# Altium footprint library General.PcbLib: 246 footprints (part 12 of 16)
Each footprint in its own frame and in the unit in brackets; x right, y up, seen from the top. Pads: shape width x height; smd on the part's side, far side on the other; paste and mask are expansions set on the pad; w line width, h text height; cw(c..) or ccw(c..) is an arc to the next point about the centre after c.
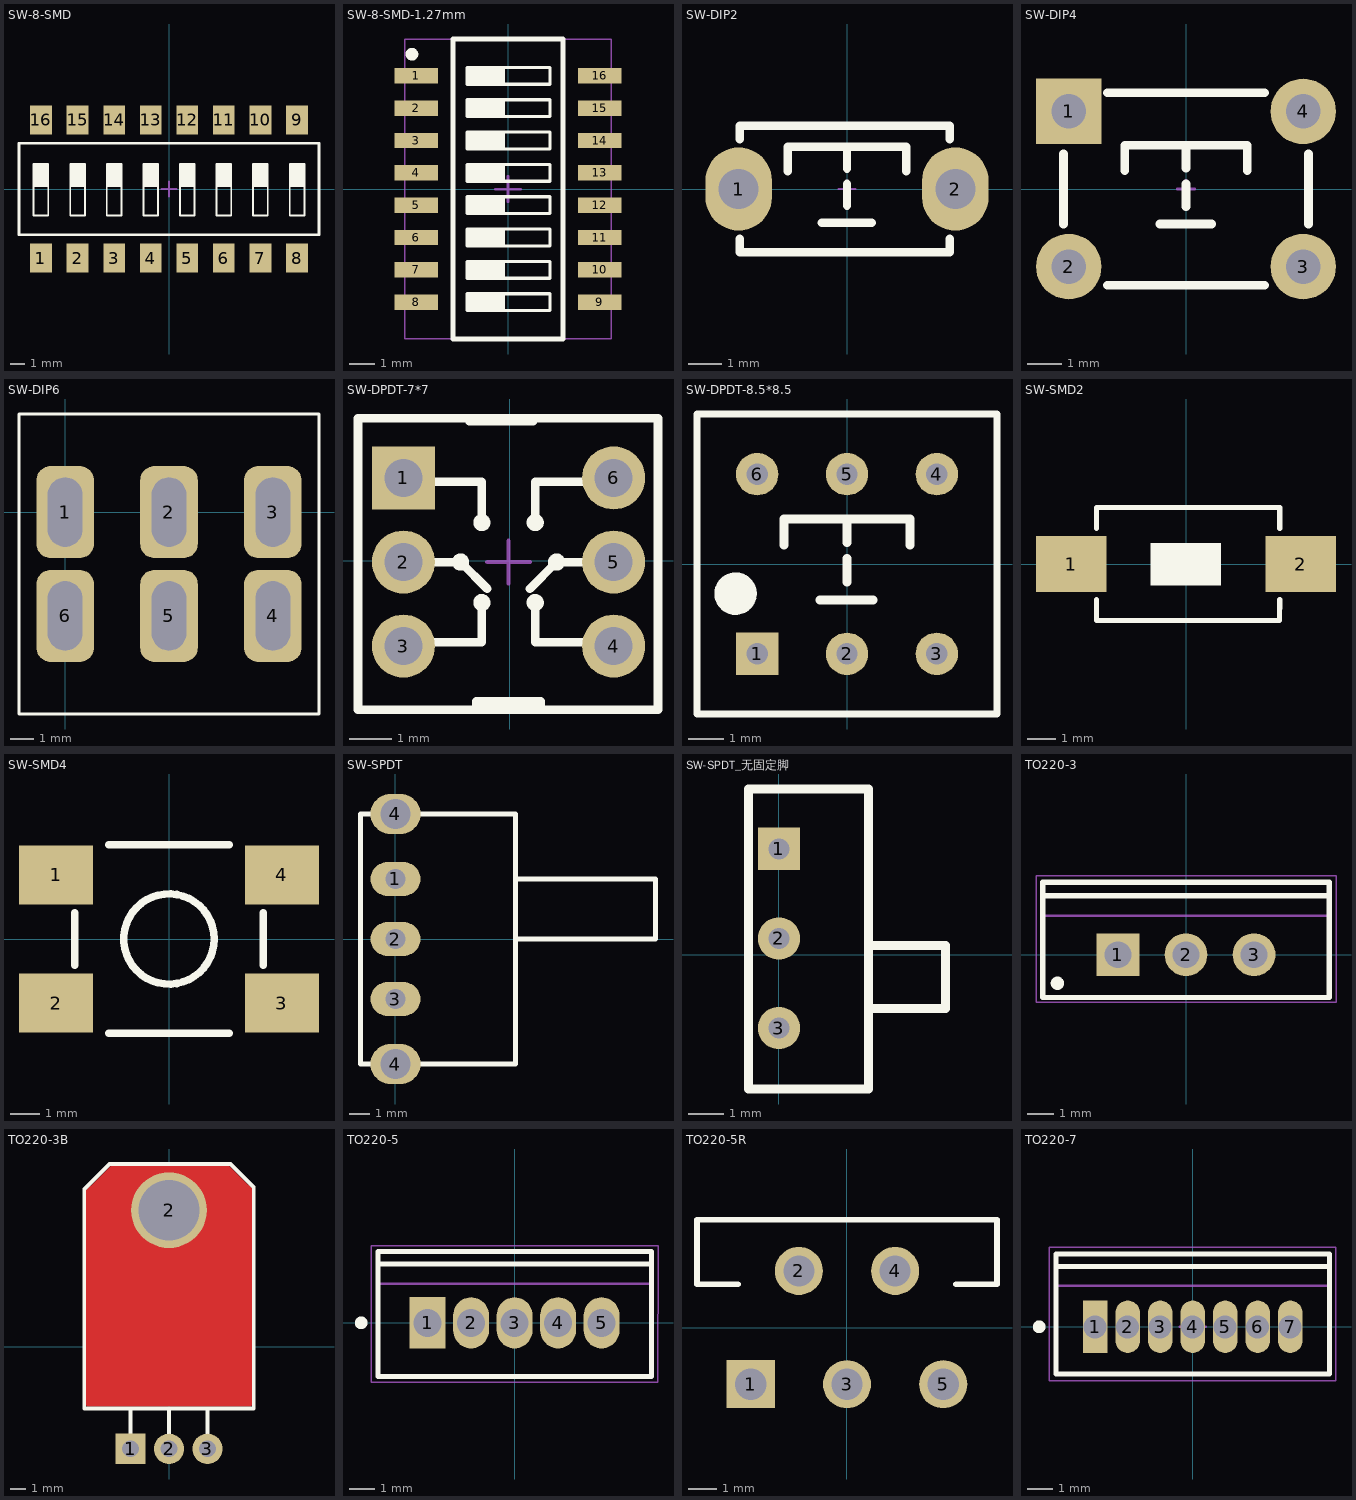
[diagram p11: the footprints below, top view; thin cyan lines are the x and y axes]

## SW-8-SMD [mm] "pitch2.54mm  8位贴片拨码开关"
height 1.75
pads (16):
  rect 1.5x2 smd: 1(-8.89,-4.8) 2(-6.35,-4.8) 3(-3.81,-4.8) 4(-1.27,-4.8) 5(1.27,-4.8) 6(3.81,-4.8) 7(6.35,-4.8) 8(8.89,-4.8) 9(8.89,4.8) 10(6.35,4.8) 11(3.81,4.8) 12(1.27,4.8) 13(-1.27,4.8) 14(-3.81,4.8) 15(-6.35,4.8) 16(-8.89,4.8)
Top Overlay:
  rectangle: 8.382,0.203 9.398,1.727
  rectangle: 5.842,0.203 6.858,1.727
  rectangle: 3.302,0.203 4.318,1.727
  rectangle: 0.762,0.203 1.778,1.727
  rectangle: -9.398,0.203 -8.382,1.727
  rectangle: -6.858,0.203 -5.842,1.727
  rectangle: -4.318,0.203 -3.302,1.727
  rectangle: -1.778,0.203 -0.762,1.727
  lines w0.127: -9.398,0.203 -8.382,0.203 ; -6.858,0.203 -5.842,0.203 ; -4.318,0.203 -3.302,0.203 ; -1.778,0.203 -0.762,0.203 ; 0.762,0.203 1.778,0.203 ; 3.302,0.203 4.318,0.203 ; 5.842,0.203 6.858,0.203 ; 8.382,0.203 9.398,0.203 ; -9.398,-1.829 -9.398,1.727 -8.382,1.727 -8.382,-1.829 -9.398,-1.829 ; -6.858,-1.829 -6.858,1.727 -5.842,1.727 -5.842,-1.829 -6.858,-1.829 ; -4.318,-1.829 -4.318,1.727 -3.302,1.727 -3.302,-1.829 -4.318,-1.829 ; -1.778,-1.829 -1.778,1.727 -0.762,1.727 -0.762,-1.829 -1.778,-1.829 ; 0.762,-1.829 1.778,-1.829 1.778,1.727 0.762,1.727 0.762,-1.829 ; 3.302,-1.829 4.318,-1.829 4.318,1.727 3.302,1.727 3.302,-1.829 ; 5.842,-1.829 6.858,-1.829 6.858,1.727 5.842,1.727 5.842,-1.829 ; 8.382,-1.829 9.398,-1.829 9.398,1.727 8.382,1.727 8.382,-1.829
  lines w0.2: -10.414,-0.861 -10.414,3.175 10.414,3.175 10.414,-3.175 -10.414,-3.175 -10.414,-0.762
Mechanical 15:
  lines w0.15: -0.508,0 0.508,0 ; 0,-0.508 0,0.508
3D body "User Library-smt_dip_sw_8pos.step": height 6.05, standoff 0, extent -11.075,-5.14 11.025,5.14

## SW-8-SMD-1.27mm [mm] "SWITCH, 16-Leads, Pitch 1.27mm"
height 2.3
pads (16):
  rect 1.7x0.6 smd: 1(-3.6,4.445) 2(-3.6,3.175) 3(-3.6,1.905) 4(-3.6,0.635) 5(-3.6,-0.635) 6(-3.6,-1.905) 7(-3.6,-3.175) 8(-3.6,-4.445) 9(3.6,-4.445) 10(3.6,-3.175) 11(3.6,-1.905) 12(3.6,-0.635) 13(3.6,0.635) 14(3.6,1.905) 15(3.6,3.175) 16(3.6,4.445)
Top Overlay:
  circle w0.25: c-3.775,5.295 r0.125
  region: -0.178,0.33 -0.178,0.965 -1.6,0.965 -1.6,0.33
  region: -0.178,-0.94 -0.178,-0.305 -1.6,-0.305 -1.6,-0.94
  region: -0.178,-4.75 -0.178,-4.115 -1.6,-4.115 -1.6,-4.75
  region: -0.178,-3.48 -0.178,-2.845 -1.6,-2.845 -1.6,-3.48
  region: -0.178,-2.21 -0.178,-1.575 -1.6,-1.575 -1.6,-2.21
  region: -0.178,4.14 -0.178,4.75 -1.6,4.75 -1.6,4.14
  region: -0.178,2.87 -0.178,3.505 -1.6,3.505 -1.6,2.87
  region: -0.178,1.6 -0.178,2.235 -1.6,2.235 -1.6,1.6
  lines w0.127: -0.178,-4.75 -0.178,-4.14 ; -0.178,-3.48 -0.178,-2.87 ; -0.178,-2.21 -0.178,-1.6 ; -0.178,-0.94 -0.178,-0.33 ; -0.178,0.33 -0.178,0.94 ; -0.178,1.6 -0.178,2.21 ; -0.178,2.87 -0.178,3.48 ; -0.178,4.14 -0.178,4.75 ; -1.6,-4.775 1.651,-4.775 1.651,-4.115 -1.6,-4.115 -1.6,-4.775 ; -1.6,-3.505 -1.6,-2.845 1.651,-2.845 1.651,-3.505 -1.6,-3.505 ; -1.6,-2.235 -1.6,-1.575 1.651,-1.575 1.651,-2.235 -1.6,-2.235 ; -1.6,-0.965 -1.6,-0.305 1.651,-0.305 1.651,-0.965 -1.6,-0.965 ; -1.6,0.305 1.651,0.305 1.651,0.965 -1.6,0.965 -1.6,0.305 ; -1.6,1.575 1.651,1.575 1.651,2.235 -1.6,2.235 -1.6,1.575 ; -1.6,2.845 1.651,2.845 1.651,3.505 -1.6,3.505 -1.6,2.845 ; -1.6,4.115 -1.6,4.775 1.651,4.775 1.651,4.115 -1.6,4.115
  lines w0.2: -2.159,-5.89 2.159,-5.89 2.159,5.89 -2.159,5.89 -2.159,-5.89
Mechanical 13:
  lines w0.1: -2.159,-5.89 2.159,-5.89 2.159,5.89 -2.159,5.89 -2.159,-5.89
Mechanical 15:
  lines w0.05: -4.064,-4.623 -4.064,2.083 ; 4.064,-4.623 4.064,2.083 ; -4.064,-5.89 4.064,-5.89 4.064,5.893 -4.064,5.893 -4.064,-5.89
  lines w0.1: -0.5,0 0.5,0 ; 0,-0.5 0,0.5
3D body "12345678.step": height 2.1, standoff -0.5, extent -4.22,-5.665 4.22,5.665

## SW-DIP2 [mm] "3*6*4.3mm"
pads (2):
  oval 2x2.5 hole 1.2: 1(-3.25,0) 2(3.25,0)
Top Overlay:
  lines w0.254: -3.212,-1.499 -3.212,-1.9 3.088,-1.9 3.088,-1.499 ; -3.212,1.499 -3.212,1.9 3.088,1.9 3.088,1.499 ; -1.778,0.533 -1.778,1.27 1.778,1.27 1.778,0.533 ; -0.762,-1.016 0.737,-1.016 ; 0,-0.508 0,0.152 ; 0,0.61 0,1.27
Mechanical 15:
  lines w0.051: -0.254,0 0.254,0 ; 0,-0.254 0,0.254
3D body "TSW DIP-3x6x4.3.STEP": height 4.31, standoff -3.49, extent -3.914,-1.75 3.914,1.75

## SW-DIP4 [mm] "直插4脚微动开关"
pads (4):
  rect 1.9x1.9 hole 1: 1(-3.4,2.25)
  round 1.9 hole 1: 2(-3.4,-2.25) 3(3.4,-2.25) 4(3.4,2.25)
Top Overlay:
  lines w0.254: -3.556,-1.016 -3.556,1.016 ; -2.286,-2.794 2.286,-2.794 ; -2.286,2.794 2.286,2.794 ; -1.778,0.533 -1.778,1.27 1.778,1.27 1.778,0.533 ; -0.762,-1.016 0.737,-1.016 ; 0,-0.508 0,0.152 ; 0,0.61 0,1.27 ; 3.556,-1.016 3.556,1.016
Mechanical 15:
  lines w0.076: -0.254,0 0.254,0 ; 0,-0.254 0,0.254
3D body "TSW DIP-6x6x4.3.STEP": height 4.25, standoff -3.45, extent -4.106,-3 4.106,3

## SW-DIP6 [mm] "双掷开关"
pads (6):
  rrect50% 2.5x4 hole 1.5 slot 3 at 90 deg: 1(0,0) 2(4.5,0) 3(9,0) 4(9,-4.5) 5(4.5,-4.5) 6(0,-4.5)
Top Overlay:
  lines w0.127: -2,-8.75 -2,-2.25 -2,4.25 4.5,4.25 11,4.25 11,-8.75 -2,-8.75
3D body "SW3dPS-SW-113.STEP": height 30.58, standoff -3.96, extent -1.85,-8.181 10.85,3.63

## SW-DPDT-7*7 [mm]
pads (6):
  rect 1.5x1.5 hole 0.9: 1(-2.525,1.975)
  round 1.5 hole 0.9: 2(-2.525,-0.025) 3(-2.525,-2.025) 4(2.475,-2.025) 5(2.475,-0.025) 6(2.475,1.975)
Top Overlay:
  circle w0.254: c0.61,0.914 r0.076
  circle w0.254: c-0.66,0.914 r0.076
  circle w0.254: c0.61,-0.991 r0.076
  circle w0.254: c-0.66,-0.991 r0.076
  circle w0.254: c1.118,-0.025 r0.076
  circle w0.254: c-1.168,-0.025 r0.076
  lines w0.203: -2.565,-1.93 -1.549,-1.93 -0.66,-1.93 -0.66,-0.914 ; -2.565,-0.025 -1.168,-0.025 -0.533,-0.66 ; -2.565,1.88 -0.66,1.88 -0.66,0.991 ; -0.965,3.319 0.559,3.319 ; -0.787,-3.539 -0.787,-3.334 0.737,-3.334 0.737,-3.539 ; 0.483,-0.66 1.118,-0.025 2.515,-0.025 ; 0.61,-0.914 0.61,-1.93 2.515,-1.93 ; 0.61,0.991 0.61,1.88 2.515,1.88 ; -3.607,-3.539 -3.607,3.395 3.531,3.395 3.531,-3.539 2.515,-3.539 -3.607,-3.539
Mechanical 15:
  lines w0.1: -0.533,-0.025 0.483,-0.025 ; -0.025,-0.533 -0.025,0.483
3D body "SLSW 7x7.STEP": height 11.2, standoff -3.2, extent -3.525,-3.525 3.475,3.475

## SW-DPDT-8.5*8.5 [mm]
pads (6):
  rect 1.2x1.2 hole 0.6: 1(-2.54,-2.54)
  round 1.2 hole 0.6: 2(0,-2.54) 3(2.54,-2.54) 4(2.54,2.54) 5(0,2.54) 6(-2.54,2.54)
Top Overlay:
  circle w0.6: c-3.15,-0.838 r0.3
  lines w0.2: -4.242,-4.242 4.242,-4.242 4.242,4.242 -4.242,4.242 -4.242,-4.242
  lines w0.254: -1.778,0.533 -1.778,1.27 1.778,1.27 1.778,0.533 ; -0.762,-1.016 0.737,-1.016 ; 0,-0.508 0,0.152 ; 0,0.61 0,1.27
3D body "User Library-Switch_6pin.step": height 14, standoff -3, extent -4.25,-4.25 4.25,4.25

## SW-SMD2 [mm] "贴片2脚微动开关"
pads (2):
  rect 2.5x2 smd: 1(-4.064,0) 2(4.064,0)
Top Overlay:
  rectangle: -1.255,-0.762 1.245,0.738
  lines w0.178: -3.179,-1.25 -3.179,-2 3.317,-2 3.321,-1.25 ; -3.179,1.25 -3.179,2 3.321,2 3.321,1.25
3D body "User Library-TL3302BF180QC-1.step": height 5, standoff 0, extent -5.2,-1.75 5.2,1.75

## SW-SMD4 [mm] "贴片4脚微动开关"
pads (4):
  rect 2.5x2 smd: 1(-3.81,2.159) 2(-3.81,-2.159) 3(3.81,-2.159) 4(3.81,2.159)
Top Overlay:
  circle w0.254: c0,0 r1.524
  lines w0.25: -3.175,-0.889 -3.175,0.889 ; -2.032,-3.175 2.032,-3.175 ; -2.032,3.175 2.032,3.175 ; 3.175,-0.889 3.175,0.889
3D body "User Library-KT11P2SM.STEP": height 5.45, standoff -0.08, extent -5.017,-3.169 5.017,3.175

## SW-SPDT [mm] "侧卧拨动开关"
pads (5):
  oval 2.5x1.7 hole 1: 1(0,3) 2(0,0) 3(0,-3)
  oval 2.5x2 hole 1.5: 4(0,-6.25) 4(0,6.25)
Top Overlay:
  lines w0.254: 6,0 13,0 13,3 6,3 ; -1.75,-6.25 -1.75,6.25 -1.5,6.25 0,6.25 6,6.25 6,-6.25 0,-6.25 -1.75,-6.25
3D body "User Library-SLIDE SWITCH SS12F23.STEP": height 5.75, standoff -3.35, extent -0.608,-6.523 12.292,6.477

## SW-SPDT_无固定脚 [mm] "侧卧拨动开关"
pads (3):
  rect 1.2x1.2 hole 0.6: 1(0,3)
  round 1.2 hole 0.6: 2(0,0.46) 3(0,-2.08)
Top Overlay:
  lines w0.254: 2.54,-1.524 4.724,-1.524 4.724,0.254 2.54,0.254 ; -0.864,-3.81 2.54,-3.81 2.54,4.699 -0.864,4.699 -0.864,-3.81
3D body "User Library-eg1270.STEP": height 4.28, standoff -2.52, extent -0.78,-3.793 4.72,4.707

## TO220-3 [mm] "TO, Thru-Hole, Vertical, Heatsink Mounted; 3 In-Line Leads; Pitch 2.54 mm"
height 19.4
pads (3):
  rect 1.6x1.6 hole 1: 1(-2.54,0)
  round 1.6 hole 1: 2(0,0) 3(2.54,0)
Top Overlay:
  circle w0.25: c-4.801,-1.067 r0.125
  lines w0.2: -5.35,2.2 5.35,2.2 ; -5.35,-1.6 -5.35,2.7 5.35,2.7 5.35,-1.6 -5.35,-1.6
Mechanical 13:
  lines w0.1: -5.35,1.45 5.35,1.45 ; -5.35,-1.6 5.35,-1.6 5.35,2.7 -5.35,2.7 -5.35,-1.6
Mechanical 15:
  lines w0.05: -5.6,-1.778 5.6,-1.778 5.6,2.95 -5.6,2.95 -5.6,-1.778
  lines w0.1: -0.5,0 0.5,0 ; 0,-0.5 0,0.5
3D body "User Library-Transistors TO-220 3L.STEP": height 19.1, standoff -9.37, extent -5.08,-1.557 5.08,2.794

## TO220-3B [mm] "220，3脚晶体管"
pads (4):
  rect 2x2 hole 1.1: 1(-2.54,-6.731)
  round 2 hole 1.1: 2(0,-6.731) 3(2.54,-6.731)
  round 5 hole 4: 2(0,9.017)
Top Layer:
  rectangle: -5.334,-3.81 5.334,10.287
  rectangle: -3.81,10.16 4.064,11.811
  rectangle: 4.064,10.16 4.699,11.049
  rectangle: -4.572,10.16 -3.81,10.922
  rectangle: -4.318,10.922 -3.81,11.303
  rectangle: -4.826,10.287 -4.572,10.795
  rectangle: 4.445,10.16 5.143,10.604
  rectangle: 3.81,10.795 4.445,11.303
  lines w0.254: -5.207,10.16 -3.81,11.557 ; -4.826,10.287 -3.81,11.303 ; 3.937,11.557 4.826,10.541 5.334,10.287 4.699,10.795 ; -5.334,-3.81 -5.334,9.906 -5.334,10.287 -4.826,10.795 -3.81,11.811 3.429,11.811 3.937,11.811 4.953,10.795 5.334,10.414 5.334,-3.302 5.334,-3.81 -5.08,-3.81 -5.334,-3.81
Top Overlay:
  lines w0.254: -2.54,-5.994 -2.54,-4.064 ; 0,-6.02 0,-4.064 ; 2.54,-6.045 2.54,-4.064 ; -5.588,-4.064 5.588,-4.064 5.588,10.541 4.064,12.065 -3.937,12.065 -5.588,10.414 -5.588,-4.064
3D body "TO220B.STEP": height 4.43, standoff -3, extent -5.15,-6.981 5.15,11.769

## TO220-5 [mm]
pads (5):
  rect 1.4x2 hole 1.1: 1(-3.4,0)
  oval 1.4x2 hole 1.1: 2(-1.7,0) 3(0,0) 4(1.7,0) 5(3.4,0)
Top Overlay:
  circle w0.25: c-5.995,0 r0.125
  lines w0.2: -5.345,2.295 5.355,2.295 ; -5.345,-2.105 -5.345,2.795 5.355,2.795 5.355,-2.105 -5.345,-2.105
Mechanical 13:
  lines w0.1: -5.345,1.52 5.355,1.52 ; -5.345,-2.08 5.355,-2.08 5.355,2.77 -5.345,2.77 -5.345,-2.08
Mechanical 15:
  lines w0.05: -5.595,-2.33 5.605,-2.33 5.605,3.02 -5.595,3.02 -5.595,-2.33
  lines w0.1: -0.495,0 0.505,0 ; 0.005,-0.5 0.005,0.5
3D body "alsrobot-TO-220-5H.STEP": height 15.06, standoff 0.23, extent -5.081,-1.778 5.081,2.743

## TO220-5R [mm]
height 21.1
pads (5):
  rect 1.7x1.7 hole 1.1: 1(-3.4,-2)
  round 1.7 hole 1.1: 2(-1.7,2) 3(0,-2) 4(1.7,2) 5(3.4,-2)
Top Overlay:
  lines w0.2: -3.854,1.53 -5.3,1.53 -5.3,3.81 5.3,3.81 5.3,1.53 3.854,1.53
3D body "NDH0005D.stp": height 21.08, standoff -2.87, extent -5.08,-2.172 5.08,6.299

## TO220-7 [mm] "Flange Mount, 7-Leads, Body 10.16x4.58mm, Pitch 1.27mm"
height 15.11
pads (7):
  rect 0.95x2.05 hole 0.9: 1(-3.81,0)
  oval 0.95x2.05 hole 0.9: 2(-2.54,0) 3(-1.27,0) 4(0,0) 5(1.27,0) 6(2.54,0) 7(3.81,0)
Top Overlay:
  circle w0.25: c-6,0 r0.125
  lines w0.2: -5.35,2.35 5.35,2.35 ; -5.35,-1.85 -5.35,2.85 5.35,2.85 5.35,-1.85 -5.35,-1.85
Mechanical 13:
  lines w0.1: -5.35,1.6 5.35,1.6 ; -5.35,-1.85 5.35,-1.85 5.35,2.85 -5.35,2.85 -5.35,-1.85
Mechanical 15:
  lines w0.05: -5.6,-2.1 5.6,-2.1 5.6,3.1 -5.6,3.1 -5.6,-2.1
  lines w0.1: -0.5,0 0.5,0 ; 0,-0.5 0,0.5
3D body: height 0, standoff -1.6, extent -4.165,-0.235 -3.455,0.235
3D body: height 0, standoff -1.6, extent -2.895,-0.235 -2.185,0.235
3D body: height 0, standoff -1.6, extent -1.625,-0.235 -0.915,0.235
3D body: height 0, standoff -1.6, extent -0.355,-0.235 0.355,0.235
3D body: height 0, standoff -1.6, extent 0.915,-0.235 1.625,0.235
3D body: height 0, standoff -1.6, extent 2.185,-0.235 2.895,0.235
3D body: height 0, standoff -1.6, extent 3.455,-0.235 4.165,0.235
3D body: height 8.76, standoff 0, extent -5.35,-1.85 5.35,2.85
3D body: height 10.44, standoff 8.76, extent -5.075,1.6 5.075,2.85
3D body: height 10.48, standoff 10.44, extent -5.075,1.6 -0.376,2.85
3D body: height 10.48, standoff 10.44, extent 0.376,1.6 5.075,2.85
3D body: height 14.29, standoff 14.25, extent -5.075,1.6 -0.376,2.85
3D body: height 14.29, standoff 14.25, extent 0.376,1.6 5.075,2.85
3D body: height 10.59, standoff 10.47, extent -5.075,1.6 -0.737,2.85
3D body: height 10.59, standoff 10.47, extent 0.737,1.6 5.075,2.85
3D body: height 14.25, standoff 14.14, extent -5.075,1.6 -0.737,2.85
3D body: height 14.25, standoff 14.14, extent 0.737,1.6 5.075,2.85
3D body: height 10.76, standoff 10.58, extent -5.075,1.6 -1.069,2.85
3D body: height 10.76, standoff 10.58, extent 1.069,1.6 5.075,2.85
3D body: height 14.14, standoff 13.96, extent -5.075,1.6 -1.069,2.85
3D body: height 14.14, standoff 13.96, extent 1.069,1.6 5.075,2.85
3D body: height 11, standoff 10.76, extent -5.075,1.6 -1.361,2.85
3D body: height 11, standoff 10.76, extent 1.361,1.6 5.075,2.85
3D body: height 13.97, standoff 13.72, extent -5.075,1.6 -1.361,2.85
3D body: height 13.97, standoff 13.72, extent 1.361,1.6 5.075,2.85
3D body: height 11.3, standoff 11, extent -5.075,1.6 -1.601,2.85
3D body: height 11.3, standoff 11, extent 1.601,1.6 5.075,2.85
3D body: height 13.73, standoff 13.43, extent -5.075,1.6 -1.601,2.85
3D body: height 13.73, standoff 13.43, extent 1.601,1.6 5.075,2.85
3D body: height 11.63, standoff 11.29, extent -5.075,1.6 -1.778,2.85
3D body: height 11.63, standoff 11.29, extent 1.778,1.6 5.075,2.85
3D body: height 13.43, standoff 13.1, extent -5.075,1.6 -1.778,2.85
3D body: height 13.43, standoff 13.1, extent 1.778,1.6 5.075,2.85
3D body: height 11.99, standoff 11.62, extent -5.075,1.6 -1.888,2.85
3D body: height 11.99, standoff 11.62, extent 1.888,1.6 5.075,2.85
3D body: height 13.1, standoff 12.74, extent -5.075,1.6 -1.888,2.85
3D body: height 13.1, standoff 12.74, extent 1.888,1.6 5.075,2.85
3D body: height 12.36, standoff 11.98, extent -5.075,1.6 -1.925,2.85
3D body: height 12.36, standoff 11.98, extent 1.925,1.6 5.075,2.85
3D body: height 12.74, standoff 12.36, extent -5.075,1.6 -1.925,2.85
3D body: height 12.74, standoff 12.36, extent 1.925,1.6 5.075,2.85
3D body: height 15.11, standoff 14.29, extent -5.075,1.6 5.075,2.85